# Altium schematic symbol library jlcpcb_2025_04_inductors_extended_0603.schlib: 1269 symbols (part 3 of 7) (continued)
## LQM18NNR68K00D
designator L?  Inductance: 680nH
Inductor, 680nH, ±10%, 1.7Ω, 35mA, SMD 0603; Manufacturer: Murata Electronics; Manufacturer Part Number: LQM18NNR68K00D; Self-Resonant Frequency: 90MHz; Q Factor: 15@25MHz; Package Size: 0603; JLCPCB Basic Part: No; JLCPCB Part Number: C341780; Supplier 1: LCSC; Category: Inductors; Supplier Part Number 1: C341780; Tolerance: ±10%; Rated Current: 35mA; DC Resistance: 1.7Ω; RoHS: Yes; ComponentLink1Description: Datasheet; ComponentLink1URL: https://wmsc.lcsc.com/wmsc/upload/file/pdf/v2/lcsc/2304140030_Murata-Electronics-LQM18NNR68K00D_C341780.pdf; ComponentLink2Description: JLCPCB Part URL; ComponentLink2URL: https://jlcpcb.com/partdetail/C341780; ComponentLink3Description: LCSC Part URL; ComponentLink3URL: https://lcsc.com/product-detail/Inductors-SMD_Murata-Electronics-Murata-Electronics-LQM18NNR68K00D_C341780.html
footprint IND-0603 (0603 (1608M) Inductor)
pins: 1, 2

## LQM18NNR82K00D
designator L?  Inductance: 820nH
Inductor, 820nH, ±10%, 2.1Ω, 35mA, SMD 0603; Manufacturer: Murata Electronics; Manufacturer Part Number: LQM18NNR82K00D; Self-Resonant Frequency: 85MHz; Q Factor: 15@25MHz; Package Size: 0603; JLCPCB Basic Part: No; JLCPCB Part Number: C882485; Supplier 1: LCSC; Category: Inductors; Supplier Part Number 1: C882485; Tolerance: ±10%; Rated Current: 35mA; DC Resistance: 2.1Ω; RoHS: Yes; ComponentLink1Description: Datasheet; ComponentLink1URL: https://wmsc.lcsc.com/wmsc/upload/file/pdf/v2/lcsc/2304140030_Murata-Electronics-LQM18NNR82K00D_C882485.pdf; ComponentLink2Description: JLCPCB Part URL; ComponentLink2URL: https://jlcpcb.com/partdetail/C882485; ComponentLink3Description: LCSC Part URL; ComponentLink3URL: https://lcsc.com/product-detail/Inductors-SMD_Murata-Electronics-Murata-Electronics-LQM18NNR82K00D_C882485.html
footprint IND-0603 (0603 (1608M) Inductor)
pins: 1, 2

## LQM18PH1R0MFRL
designator L?  Inductance: 1uH
Inductor, 1uH, ±20%, 200mΩ, SMD 0603; Manufacturer: Murata Electronics; Manufacturer Part Number: LQM18PH1R0MFRL; Saturation Current: 360mA; Self-Resonant Frequency: 100MHz; Package Size: 0603; JLCPCB Basic Part: No; JLCPCB Part Number: C1858042; Supplier 1: LCSC; Category: Inductors; Supplier Part Number 1: C1858042; Tolerance: ±20%; DC Resistance: 200mΩ; RoHS: Yes; ComponentLink1Description: Datasheet; ComponentLink1URL: https://wmsc.lcsc.com/wmsc/upload/file/pdf/v2/lcsc/2304140030_Murata-Electronics-LQM18PH1R0MFRL_C1858042.pdf; ComponentLink2Description: JLCPCB Part URL; ComponentLink2URL: https://jlcpcb.com/partdetail/C1858042; ComponentLink3Description: LCSC Part URL; ComponentLink3URL: https://lcsc.com/product-detail/Inductors-SMD_Murata-Electronics-Murata-Electronics-LQM18PH1R0MFRL_C1858042.html
footprint IND-0603 (0603 (1608M) Inductor)
pins: 1, 2

## LQM18PH2R2MFRL
designator L?  Inductance: 2.2uH
Inductor, 2.2uH, ±20%, 300mΩ, SMD 0603; Manufacturer: Murata Electronics; Manufacturer Part Number: LQM18PH2R2MFRL; Saturation Current: 150mA; Self-Resonant Frequency: 70MHz; Package Size: 0603; JLCPCB Basic Part: No; JLCPCB Part Number: C560036; Supplier 1: LCSC; Category: Inductors; Supplier Part Number 1: C560036; Tolerance: ±20%; DC Resistance: 300mΩ; RoHS: Yes; ComponentLink1Description: Datasheet; ComponentLink1URL: https://wmsc.lcsc.com/wmsc/upload/file/pdf/v2/lcsc/2008070932_Murata-Electronics-LQM18PH2R2MFRL_C560036.pdf; ComponentLink2Description: JLCPCB Part URL; ComponentLink2URL: https://jlcpcb.com/partdetail/C560036; ComponentLink3Description: LCSC Part URL; ComponentLink3URL: https://lcsc.com/product-detail/Inductors-SMD_Murata-Electronics-Murata-Electronics-LQM18PH2R2MFRL_C560036.html
footprint IND-0603 (0603 (1608M) Inductor)
pins: 1, 2

## LQM18PH3R3MFRL
designator L?  Inductance: 3.3uH
Inductor, 3.3uH, ±20%, 350mΩ, SMD 0603; Manufacturer: Murata Electronics; Manufacturer Part Number: LQM18PH3R3MFRL; Saturation Current: 80mA; Self-Resonant Frequency: 60MHz; Package Size: 0603; JLCPCB Basic Part: No; JLCPCB Part Number: C1857984; Supplier 1: LCSC; Category: Inductors; Supplier Part Number 1: C1857984; Tolerance: ±20%; DC Resistance: 350mΩ; RoHS: Yes; ComponentLink1Description: Datasheet; ComponentLink1URL: https://wmsc.lcsc.com/wmsc/upload/file/pdf/v2/lcsc/2304140030_Murata-Electronics-LQM18PH3R3MFRL_C1857984.pdf; ComponentLink2Description: JLCPCB Part URL; ComponentLink2URL: https://jlcpcb.com/partdetail/C1857984; ComponentLink3Description: LCSC Part URL; ComponentLink3URL: https://lcsc.com/product-detail/Inductors-SMD_Murata-Electronics-Murata-Electronics-LQM18PH3R3MFRL_C1857984.html
footprint IND-0603 (0603 (1608M) Inductor)
pins: 1, 2

## LQM18PH4R7MFRL
designator L?  Inductance: 4.7uH
Inductor, 4.7uH, ±20%, 440mΩ, SMD 0603; Manufacturer: Murata Electronics; Manufacturer Part Number: LQM18PH4R7MFRL; Saturation Current: 70mA; Self-Resonant Frequency: 40MHz; Package Size: 0603; JLCPCB Basic Part: No; JLCPCB Part Number: C1858257; Supplier 1: LCSC; Category: Inductors; Supplier Part Number 1: C1858257; Tolerance: ±20%; DC Resistance: 440mΩ; RoHS: Yes; ComponentLink1Description: Datasheet; ComponentLink1URL: https://wmsc.lcsc.com/wmsc/upload/file/pdf/v2/lcsc/2201271430_Murata-Electronics-LQM18PH4R7MFRL_C1858257.pdf; ComponentLink2Description: JLCPCB Part URL; ComponentLink2URL: https://jlcpcb.com/partdetail/C1858257; ComponentLink3Description: LCSC Part URL; ComponentLink3URL: https://lcsc.com/product-detail/Inductors-SMD_Murata-Electronics-Murata-Electronics-LQM18PH4R7MFRL_C1858257.html
footprint IND-0603 (0603 (1608M) Inductor)
pins: 1, 2

## LQM18PHR22MFRL
designator L?  Inductance: 220nH
Inductor, 220nH, ±20%, 110mΩ, 1.25A, SMD 0603; Manufacturer: Murata Electronics; Manufacturer Part Number: LQM18PHR22MFRL; Saturation Current: 1.5A; Self-Resonant Frequency: 100MHz; Package Size: 0603; JLCPCB Basic Part: No; JLCPCB Part Number: C1858104; Supplier 1: LCSC; Category: Inductors; Supplier Part Number 1: C1858104; Tolerance: ±20%; Rated Current: 1.25A; DC Resistance: 110mΩ; RoHS: Yes; ComponentLink1Description: Datasheet; ComponentLink1URL: https://wmsc.lcsc.com/wmsc/upload/file/pdf/v2/lcsc/2304140030_Murata-Electronics-LQM18PHR22MFRL_C1858104.pdf; ComponentLink2Description: JLCPCB Part URL; ComponentLink2URL: https://jlcpcb.com/partdetail/C1858104; ComponentLink3Description: LCSC Part URL; ComponentLink3URL: https://lcsc.com/product-detail/Inductors-SMD_Murata-Electronics-Murata-Electronics-LQM18PHR22MFRL_C1858104.html
footprint IND-0603 (0603 (1608M) Inductor)
pins: 1, 2

## LQM18PN1R0MFHD
designator L?  Inductance: 1uH
Inductor, 1uH, ±20%, 130mΩ, SMD 0603; Manufacturer: Murata Electronics; Manufacturer Part Number: LQM18PN1R0MFHD; Saturation Current: 550mA; Self-Resonant Frequency: 100MHz; Package Size: 0603; JLCPCB Basic Part: No; JLCPCB Part Number: C576540; Supplier 1: LCSC; Category: Inductors; Supplier Part Number 1: C576540; Tolerance: ±20%; DC Resistance: 130mΩ; RoHS: Yes; ComponentLink1Description: Datasheet; ComponentLink1URL: https://wmsc.lcsc.com/wmsc/upload/file/pdf/v2/lcsc/2304140030_Murata-Electronics-LQM18PN1R0MFHD_C576540.pdf; ComponentLink2Description: JLCPCB Part URL; ComponentLink2URL: https://jlcpcb.com/partdetail/C576540; ComponentLink3Description: LCSC Part URL; ComponentLink3URL: https://lcsc.com/product-detail/Inductors-SMD_Murata-Electronics-Murata-Electronics-LQM18PN1R0MFHD_C576540.html
footprint IND-0603 (0603 (1608M) Inductor)
pins: 1, 2

## LQM18PN1R0MFRL
designator L?  Inductance: 1uH
Inductor, 1uH, ±20%, 200mΩ, 950mA, SMD 0603; Manufacturer: Murata Electronics; Manufacturer Part Number: LQM18PN1R0MFRL; Self-Resonant Frequency: 100MHz; Package Size: 0603; JLCPCB Basic Part: No; JLCPCB Part Number: C307603; Supplier 1: LCSC; Category: Inductors; Supplier Part Number 1: C307603; Tolerance: ±20%; Rated Current: 950mA; DC Resistance: 200mΩ; RoHS: Yes; ComponentLink1Description: Datasheet; ComponentLink1URL: https://wmsc.lcsc.com/wmsc/upload/file/pdf/v2/lcsc/1912111437_Murata-Electronics-LQM18PN1R0MFRL_C307603.pdf; ComponentLink2Description: JLCPCB Part URL; ComponentLink2URL: https://jlcpcb.com/partdetail/C307603; ComponentLink3Description: LCSC Part URL; ComponentLink3URL: https://lcsc.com/product-detail/Inductors-SMD_Murata-Electronics-Murata-Electronics-LQM18PN1R0MFRL_C307603.html
footprint IND-0603 (0603 (1608M) Inductor)
pins: 1, 2

## LQM18PN1R0MGHD
designator L?  Inductance: 1uH
Inductor, 1uH, ±20%, 200mΩ, 900mA, SMD 0603; Manufacturer: Murata Electronics; Manufacturer Part Number: LQM18PN1R0MGHD; Self-Resonant Frequency: 100MHz; Package Size: 0603; JLCPCB Basic Part: No; JLCPCB Part Number: C711163; Supplier 1: LCSC; Category: Inductors; Supplier Part Number 1: C711163; Tolerance: ±20%; Rated Current: 900mA; Saturation Current: 900mA; DC Resistance: 200mΩ; RoHS: Yes; ComponentLink1Description: Datasheet; ComponentLink1URL: https://wmsc.lcsc.com/wmsc/upload/file/pdf/v2/lcsc/2304140030_Murata-Electronics-LQM18PN1R0MGHD_C711163.pdf; ComponentLink2Description: JLCPCB Part URL; ComponentLink2URL: https://jlcpcb.com/partdetail/C711163; ComponentLink3Description: LCSC Part URL; ComponentLink3URL: https://lcsc.com/product-detail/Inductors-SMD_Murata-Electronics-Murata-Electronics-LQM18PN1R0MGHD_C711163.html
footprint IND-0603 (0603 (1608M) Inductor)
pins: 1, 2

## LQM18PN1R0NC0L
designator L?  Inductance: 1uH
Inductor, 1uH, ±30%, 200mΩ, 750mA, SMD 0603; Manufacturer: Murata Electronics; Manufacturer Part Number: LQM18PN1R0NC0L; Self-Resonant Frequency: 50MHz; Package Size: 0603; JLCPCB Basic Part: No; JLCPCB Part Number: C668455; Supplier 1: LCSC; Category: Inductors; Supplier Part Number 1: C668455; Tolerance: ±30%; Rated Current: 750mA; DC Resistance: 200mΩ; RoHS: Yes; ComponentLink1Description: Datasheet; ComponentLink1URL: https://wmsc.lcsc.com/wmsc/upload/file/pdf/v2/lcsc/2304140030_Murata-Electronics-LQM18PN1R0NC0L_C668455.pdf; ComponentLink2Description: JLCPCB Part URL; ComponentLink2URL: https://jlcpcb.com/partdetail/C668455; ComponentLink3Description: LCSC Part URL; ComponentLink3URL: https://lcsc.com/product-detail/Inductors-SMD_Murata-Electronics-Murata-Electronics-LQM18PN1R0NC0L_C668455.html
footprint IND-0603 (0603 (1608M) Inductor)
pins: 1, 2

## LQM18PN1R0NF0L
designator L?  Inductance: 1uH
Inductor, 1uH, ±30%, 350mΩ, 600mA, SMD 0603; Manufacturer: Murata Electronics; Manufacturer Part Number: LQM18PN1R0NF0L; Self-Resonant Frequency: 50MHz; Package Size: 0603; JLCPCB Basic Part: No; JLCPCB Part Number: C440234; Supplier 1: LCSC; Category: Inductors; Supplier Part Number 1: C440234; Tolerance: ±30%; Rated Current: 600mA; DC Resistance: 350mΩ; RoHS: Yes; ComponentLink1Description: Datasheet; ComponentLink1URL: https://wmsc.lcsc.com/wmsc/upload/file/pdf/v2/lcsc/2304140030_Murata-Electronics-LQM18PN1R0NF0L_C440234.pdf; ComponentLink2Description: JLCPCB Part URL; ComponentLink2URL: https://jlcpcb.com/partdetail/C440234; ComponentLink3Description: LCSC Part URL; ComponentLink3URL: https://lcsc.com/product-detail/Inductors-SMD_Murata-Electronics-Murata-Electronics-LQM18PN1R0NF0L_C440234.html
footprint IND-0603 (0603 (1608M) Inductor)
pins: 1, 2

## LQM18PN1R5MFRL
designator L?  Inductance: 1.5uH
Inductor, 1.5uH, ±20%, 230mΩ, 800mA, SMD 0603; Manufacturer: Murata Electronics; Manufacturer Part Number: LQM18PN1R5MFRL; Package Size: 0603; JLCPCB Basic Part: No; JLCPCB Part Number: C337909; Supplier 1: LCSC; Category: Inductors; Supplier Part Number 1: C337909; Tolerance: ±20%; Rated Current: 800mA; DC Resistance: 230mΩ; RoHS: Yes; ComponentLink1Description: Datasheet; ComponentLink1URL: https://wmsc.lcsc.com/wmsc/upload/file/pdf/v2/lcsc/2304140030_Murata-Electronics-LQM18PN1R5MFRL_C337909.pdf; ComponentLink2Description: JLCPCB Part URL; ComponentLink2URL: https://jlcpcb.com/partdetail/C337909; ComponentLink3Description: LCSC Part URL; ComponentLink3URL: https://lcsc.com/product-detail/Inductors-SMD_Murata-Electronics-Murata-Electronics-LQM18PN1R5MFRL_C337909.html
footprint IND-0603 (0603 (1608M) Inductor)
pins: 1, 2

## LQM18PN1R8NC0L
designator L?  Inductance: 1.8uH
Inductor, 1.8uH, ±30%, 240mΩ, 700mA, SMD 0603; Manufacturer: Murata Electronics; Manufacturer Part Number: LQM18PN1R8NC0L; Self-Resonant Frequency: 50MHz; Package Size: 0603; JLCPCB Basic Part: No; JLCPCB Part Number: C703135; Supplier 1: LCSC; Category: Inductors; Supplier Part Number 1: C703135; Tolerance: ±30%; Rated Current: 700mA; DC Resistance: 240mΩ; RoHS: Yes; ComponentLink1Description: Datasheet; ComponentLink1URL: https://wmsc.lcsc.com/wmsc/upload/file/pdf/v2/lcsc/2304140030_Murata-Electronics-LQM18PN1R8NC0L_C703135.pdf; ComponentLink2Description: JLCPCB Part URL; ComponentLink2URL: https://jlcpcb.com/partdetail/C703135; ComponentLink3Description: LCSC Part URL; ComponentLink3URL: https://lcsc.com/product-detail/Inductors-SMD_Murata-Electronics-Murata-Electronics-LQM18PN1R8NC0L_C703135.html
footprint IND-0603 (0603 (1608M) Inductor)
pins: 1, 2

## LQM18PN2R2MDHD
designator L?  Inductance: 2.2uH
Inductor, 2.2uH, ±20%, 380mΩ, 650mA, SMD 0603; Manufacturer: Murata Electronics; Manufacturer Part Number: LQM18PN2R2MDHD; Saturation Current: 250mA; Self-Resonant Frequency: 60MHz; Package Size: 0603; JLCPCB Basic Part: No; JLCPCB Part Number: C307604; Supplier 1: LCSC; Category: Inductors; Supplier Part Number 1: C307604; Tolerance: ±20%; Rated Current: 650mA; DC Resistance: 380mΩ; RoHS: Yes; ComponentLink1Description: Datasheet; ComponentLink1URL: https://wmsc.lcsc.com/wmsc/upload/file/pdf/v2/lcsc/2304140030_Murata-Electronics-LQM18PN2R2MDHD_C307604.pdf; ComponentLink2Description: JLCPCB Part URL; ComponentLink2URL: https://jlcpcb.com/partdetail/C307604; ComponentLink3Description: LCSC Part URL; ComponentLink3URL: https://lcsc.com/product-detail/Inductors-SMD_Murata-Electronics-Murata-Electronics-LQM18PN2R2MDHD_C307604.html
footprint IND-0603 (0603 (1608M) Inductor)
pins: 1, 2

## LQM18PN2R2MFHD
designator L?  Inductance: 2.2uH
Inductor, 2.2uH, ±20%, 380mΩ, SMD 0603; Manufacturer: Murata Electronics; Manufacturer Part Number: LQM18PN2R2MFHD; Saturation Current: 300mA; Self-Resonant Frequency: 80MHz; Package Size: 0603; JLCPCB Basic Part: No; JLCPCB Part Number: C2046248; Supplier 1: LCSC; Category: Inductors; Supplier Part Number 1: C2046248; Tolerance: ±20%; DC Resistance: 380mΩ; RoHS: Yes; ComponentLink1Description: Datasheet; ComponentLink1URL: https://wmsc.lcsc.com/wmsc/upload/file/pdf/v2/lcsc/2202010300_Murata-Electronics-LQM18PN2R2MFHD_C2046248.pdf; ComponentLink2Description: JLCPCB Part URL; ComponentLink2URL: https://jlcpcb.com/partdetail/C2046248; ComponentLink3Description: LCSC Part URL; ComponentLink3URL: https://lcsc.com/product-detail/Inductors-SMD_Murata-Electronics-Murata-Electronics-LQM18PN2R2MFHD_C2046248.html
footprint IND-0603 (0603 (1608M) Inductor)
pins: 1, 2

## LQM18PN2R2MFRL
designator L?  Inductance: 2.2uH
Inductor, 2.2uH, ±20%, 300mΩ, 750mA, SMD 0603; Manufacturer: Murata Electronics; Manufacturer Part Number: LQM18PN2R2MFRL; Self-Resonant Frequency: 70MHz; Package Size: 0603; JLCPCB Basic Part: No; JLCPCB Part Number: C337910; Supplier 1: LCSC; Category: Inductors; Supplier Part Number 1: C337910; Tolerance: ±20%; Rated Current: 750mA; DC Resistance: 300mΩ; RoHS: Yes; ComponentLink1Description: Datasheet; ComponentLink1URL: https://wmsc.lcsc.com/wmsc/upload/file/pdf/v2/lcsc/1912111437_Murata-Electronics-LQM18PN2R2MFRL_C337910.pdf; ComponentLink2Description: JLCPCB Part URL; ComponentLink2URL: https://jlcpcb.com/partdetail/C337910; ComponentLink3Description: LCSC Part URL; ComponentLink3URL: https://lcsc.com/product-detail/Inductors-SMD_Murata-Electronics-Murata-Electronics-LQM18PN2R2MFRL_C337910.html
footprint IND-0603 (0603 (1608M) Inductor)
pins: 1, 2

## LQM18PN2R2MGHD
designator L?  Inductance: 2.2uH
Inductor, 2.2uH, ±20%, 200mΩ, 350mA, SMD 0603; Manufacturer: Murata Electronics; Manufacturer Part Number: LQM18PN2R2MGHD; Saturation Current: 250mA; Self-Resonant Frequency: 70MHz; Package Size: 0603; JLCPCB Basic Part: No; JLCPCB Part Number: C337911; Supplier 1: LCSC; Category: Inductors; Supplier Part Number 1: C337911; Tolerance: ±20%; Rated Current: 350mA; DC Resistance: 200mΩ; RoHS: Yes; ComponentLink1Description: Datasheet; ComponentLink1URL: https://wmsc.lcsc.com/wmsc/upload/file/pdf/v2/lcsc/2304140030_Murata-Electronics-LQM18PN2R2MGHD_C337911.pdf; ComponentLink2Description: JLCPCB Part URL; ComponentLink2URL: https://jlcpcb.com/partdetail/C337911; ComponentLink3Description: LCSC Part URL; ComponentLink3URL: https://lcsc.com/product-detail/Inductors-SMD_Murata-Electronics-Murata-Electronics-LQM18PN2R2MGHD_C337911.html
footprint IND-0603 (0603 (1608M) Inductor)
pins: 1, 2

## LQM18PN3R3MFRL
designator L?  Inductance: 3.3uH
Inductor, 3.3uH, ±20%, 437.5mΩ, 700mA, SMD 0603; Manufacturer: Murata Electronics; Manufacturer Part Number: LQM18PN3R3MFRL; Self-Resonant Frequency: 60MHz; Package Size: 0603; JLCPCB Basic Part: No; JLCPCB Part Number: C162581; Supplier 1: LCSC; Category: Inductors; Supplier Part Number 1: C162581; Tolerance: ±20%; Rated Current: 700mA; DC Resistance: 437.5mΩ; RoHS: Yes; ComponentLink1Description: Datasheet; ComponentLink1URL: https://wmsc.lcsc.com/wmsc/upload/file/pdf/v2/lcsc/2304140030_Murata-Electronics-LQM18PN3R3MFRL_C162581.pdf; ComponentLink2Description: JLCPCB Part URL; ComponentLink2URL: https://jlcpcb.com/partdetail/C162581; ComponentLink3Description: LCSC Part URL; ComponentLink3URL: https://lcsc.com/product-detail/Inductors-SMD_Murata-Electronics-Murata-Electronics-LQM18PN3R3MFRL_C162581.html
footprint IND-0603 (0603 (1608M) Inductor)
pins: 1, 2

## LQM18PN4R7MFRL
designator L?  Inductance: 4.7uH
Inductor, 4.7uH, ±20%, 440mΩ, 620mA, SMD 0603; Manufacturer: Murata Electronics; Manufacturer Part Number: LQM18PN4R7MFRL; Self-Resonant Frequency: 40MHz; Package Size: 0603; JLCPCB Basic Part: No; JLCPCB Part Number: C114862; Supplier 1: LCSC; Category: Inductors; Supplier Part Number 1: C114862; Tolerance: ±20%; Rated Current: 620mA; DC Resistance: 440mΩ; RoHS: Yes; ComponentLink1Description: Datasheet; ComponentLink1URL: https://wmsc.lcsc.com/wmsc/upload/file/pdf/v2/lcsc/2304140030_Murata-Electronics-LQM18PN4R7MFRL_C114862.pdf; ComponentLink2Description: JLCPCB Part URL; ComponentLink2URL: https://jlcpcb.com/partdetail/C114862; ComponentLink3Description: LCSC Part URL; ComponentLink3URL: https://lcsc.com/product-detail/Inductors-SMD_Murata-Electronics-Murata-Electronics-LQM18PN4R7MFRL_C114862.html
footprint IND-0603 (0603 (1608M) Inductor)
pins: 1, 2

## LQM18PNR47MFHD
designator L?  Inductance: 470nH
Inductor, 470nH, ±20%, 100mΩ, 1.5A, SMD 0603; Manufacturer: Murata Electronics; Manufacturer Part Number: LQM18PNR47MFHD; Self-Resonant Frequency: 100MHz; Package Size: 0603; JLCPCB Basic Part: No; JLCPCB Part Number: C2044483; Supplier 1: LCSC; Category: Inductors; Supplier Part Number 1: C2044483; Tolerance: ±20%; Rated Current: 1.5A; Saturation Current: 1.5A; DC Resistance: 100mΩ; RoHS: Yes; ComponentLink1Description: Datasheet; ComponentLink1URL: https://wmsc.lcsc.com/wmsc/upload/file/pdf/v2/lcsc/2304140030_Murata-Electronics-LQM18PNR47MFHD_C2044483.pdf; ComponentLink2Description: JLCPCB Part URL; ComponentLink2URL: https://jlcpcb.com/partdetail/C2044483; ComponentLink3Description: LCSC Part URL; ComponentLink3URL: https://lcsc.com/product-detail/Inductors-SMD_Murata-Electronics-Murata-Electronics-LQM18PNR47MFHD_C2044483.html
footprint IND-0603 (0603 (1608M) Inductor)
pins: 1, 2

## LQM18PNR47NC0L
designator L?  Inductance: 470nH
Inductor, 470nH, ±30%, 150mΩ, 850mA, SMD 0603; Manufacturer: Murata Electronics; Manufacturer Part Number: LQM18PNR47NC0L; Self-Resonant Frequency: 50MHz; Package Size: 0603; JLCPCB Basic Part: No; JLCPCB Part Number: C1333176; Supplier 1: LCSC; Category: Inductors; Supplier Part Number 1: C1333176; Tolerance: ±30%; Rated Current: 850mA; DC Resistance: 150mΩ; RoHS: Yes; ComponentLink1Description: Datasheet; ComponentLink1URL: https://wmsc.lcsc.com/wmsc/upload/file/pdf/v2/lcsc/2201141500_Murata-Electronics-LQM18PNR47NC0L_C1333176.pdf; ComponentLink2Description: JLCPCB Part URL; ComponentLink2URL: https://jlcpcb.com/partdetail/C1333176; ComponentLink3Description: LCSC Part URL; ComponentLink3URL: https://lcsc.com/product-detail/Inductors-SMD_Murata-Electronics-Murata-Electronics-LQM18PNR47NC0L_C1333176.html
footprint IND-0603 (0603 (1608M) Inductor)
pins: 1, 2

## LQM18PW1R0MCHD
designator L?  Inductance: 1uH
Inductor, 1uH, ±20%, 230mΩ, SMD 0603; Manufacturer: Murata Electronics; Manufacturer Part Number: LQM18PW1R0MCHD; Saturation Current: 600mA; Self-Resonant Frequency: 70MHz; Package Size: 0603; JLCPCB Basic Part: No; JLCPCB Part Number: C909842; Supplier 1: LCSC; Category: Inductors; Supplier Part Number 1: C909842; Tolerance: ±20%; DC Resistance: 230mΩ; RoHS: Yes; ComponentLink1Description: Datasheet; ComponentLink1URL: https://wmsc.lcsc.com/wmsc/upload/file/pdf/v2/lcsc/2304140030_Murata-Electronics-LQM18PW1R0MCHD_C909842.pdf; ComponentLink2Description: JLCPCB Part URL; ComponentLink2URL: https://jlcpcb.com/partdetail/C909842; ComponentLink3Description: LCSC Part URL; ComponentLink3URL: https://lcsc.com/product-detail/Inductors-SMD_Murata-Electronics-Murata-Electronics-LQM18PW1R0MCHD_C909842.html
footprint IND-0603 (0603 (1608M) Inductor)
pins: 1, 2

## LQM18PZ2R2MFHD
designator L?  Inductance: 2.2uH
Inductor, 2.2uH, ±20%, 470mΩ, 300mA, SMD 0603; Manufacturer: Murata Electronics; Manufacturer Part Number: LQM18PZ2R2MFHD; Self-Resonant Frequency: 80MHz; Package Size: 0603; JLCPCB Basic Part: No; JLCPCB Part Number: C2041549; Supplier 1: LCSC; Category: Inductors; Supplier Part Number 1: C2041549; Tolerance: ±20%; Rated Current: 300mA; Saturation Current: 300mA; DC Resistance: 470mΩ; RoHS: Yes; ComponentLink1Description: Datasheet; ComponentLink1URL: https://wmsc.lcsc.com/wmsc/upload/file/pdf/v2/lcsc/2201312330_Murata-Electronics-LQM18PZ2R2MFHD_C2041549.pdf; ComponentLink2Description: JLCPCB Part URL; ComponentLink2URL: https://jlcpcb.com/partdetail/C2041549; ComponentLink3Description: LCSC Part URL; ComponentLink3URL: https://lcsc.com/product-detail/Inductors-SMD_Murata-Electronics-Murata-Electronics-LQM18PZ2R2MFHD_C2041549.html
footprint IND-0603 (0603 (1608M) Inductor)
pins: 1, 2

## LQP18MN8N2C02D
designator L?  Inductance: 8.2nH
Inductor, 8.2nH, 800mΩ, 150mA, SMD 0603; Manufacturer: Murata Electronics; Manufacturer Part Number: LQP18MN8N2C02D; Self-Resonant Frequency: 3.6GHz; Q Factor: 17@500MHz; Package Size: 0603; JLCPCB Basic Part: No; JLCPCB Part Number: C524640; Supplier 1: LCSC; Category: Inductors; Supplier Part Number 1: C524640; Rated Current: 150mA; DC Resistance: 800mΩ; RoHS: Yes; ComponentLink1Description: Datasheet; ComponentLink1URL: https://wmsc.lcsc.com/wmsc/upload/file/pdf/v2/lcsc/2304140030_Murata-Electronics-LQP18MN8N2C02D_C524640.pdf; ComponentLink2Description: JLCPCB Part URL; ComponentLink2URL: https://jlcpcb.com/partdetail/C524640; ComponentLink3Description: LCSC Part URL; ComponentLink3URL: https://lcsc.com/product-detail/Inductors-SMD_Murata-Electronics-Murata-Electronics-LQP18MN8N2C02D_C524640.html
footprint IND-0603 (0603 (1608M) Inductor)
pins: 1, 2

## LQP18MN22NG02D
designator L?  Inductance: 22nH
Inductor, 22nH, ±2%, 1.9Ω, 100mA, SMD 0603; Manufacturer: Murata Electronics; Manufacturer Part Number: LQP18MN22NG02D; Self-Resonant Frequency: 500MHz; Q Factor: 17@500MHz; Package Size: 0603; JLCPCB Basic Part: No; JLCPCB Part Number: C524638; Supplier 1: LCSC; Category: Inductors; Supplier Part Number 1: C524638; Tolerance: ±2%; Rated Current: 100mA; DC Resistance: 1.9Ω; RoHS: Yes; ComponentLink1Description: Datasheet; ComponentLink1URL: https://wmsc.lcsc.com/wmsc/upload/file/pdf/v2/lcsc/2304140030_Murata-Electronics-LQP18MN22NG02D_C524638.pdf; ComponentLink2Description: JLCPCB Part URL; ComponentLink2URL: https://jlcpcb.com/partdetail/C524638; ComponentLink3Description: LCSC Part URL; ComponentLink3URL: https://lcsc.com/product-detail/Inductors-SMD_Murata-Electronics-Murata-Electronics-LQP18MN22NG02D_C524638.html
footprint IND-0603 (0603 (1608M) Inductor)
pins: 1, 2

## LQW18AN2N2C80D
designator L?  Inductance: 2.2nH
Inductor, 2.2nH, 18mΩ, 3.2A, SMD 0603; Manufacturer: Murata Electronics; Manufacturer Part Number: LQW18AN2N2C80D; Self-Resonant Frequency: 15GHz; Q Factor: 24@250MHz; Package Size: 0603; JLCPCB Basic Part: No; JLCPCB Part Number: C71648; Supplier 1: LCSC; Category: Inductors; Supplier Part Number 1: C71648; Rated Current: 3.2A; DC Resistance: 18mΩ; RoHS: Yes; ComponentLink1Description: Datasheet; ComponentLink1URL: https://wmsc.lcsc.com/wmsc/upload/file/pdf/v2/lcsc/2304140030_Murata-Electronics-LQW18AN2N2C80D_C71648.pdf; ComponentLink2Description: JLCPCB Part URL; ComponentLink2URL: https://jlcpcb.com/partdetail/C71648; ComponentLink3Description: LCSC Part URL; ComponentLink3URL: https://lcsc.com/product-detail/Inductors-SMD_Murata-Electronics-Murata-Electronics-LQW18AN2N2C80D_C71648.html
footprint IND-0603 (0603 (1608M) Inductor)
pins: 1, 2

## LQW18AN2N2D0ZD
designator L?  Inductance: 2.2nH
Inductor, 2.2nH, 42mΩ, SMD 0603; Manufacturer: Murata Electronics; Manufacturer Part Number: LQW18AN2N2D0ZD; Self-Resonant Frequency: 6GHz; Q Factor: 16@250MHz; Package Size: 0603; JLCPCB Basic Part: No; JLCPCB Part Number: C237544; Supplier 1: LCSC; Category: Inductors; Supplier Part Number 1: C237544; DC Resistance: 42mΩ; RoHS: Yes; ComponentLink1Description: Datasheet; ComponentLink1URL: https://wmsc.lcsc.com/wmsc/upload/file/pdf/v2/lcsc/2304140030_Murata-Electronics-LQW18AN2N2D0ZD_C237544.pdf; ComponentLink2Description: JLCPCB Part URL; ComponentLink2URL: https://jlcpcb.com/partdetail/C237544; ComponentLink3Description: LCSC Part URL; ComponentLink3URL: https://lcsc.com/product-detail/Inductors-SMD_Murata-Electronics-Murata-Electronics-LQW18AN2N2D0ZD_C237544.html
footprint IND-0603 (0603 (1608M) Inductor)
pins: 1, 2

## LQW18AN2N2D10D
designator L?  Inductance: 2.2nH
Inductor, 2.2nH, 18mΩ, 1.4A, SMD 0603; Manufacturer: Murata Electronics; Manufacturer Part Number: LQW18AN2N2D10D; Package Size: 0603; JLCPCB Basic Part: No; JLCPCB Part Number: C701164; Supplier 1: LCSC; Category: Inductors; Supplier Part Number 1: C701164; Rated Current: 1.4A; DC Resistance: 18mΩ; RoHS: Yes; ComponentLink1Description: Datasheet; ComponentLink1URL: https://wmsc.lcsc.com/wmsc/upload/file/pdf/v2/lcsc/2009291135_Murata-Electronics-LQW18AN2N2D10D_C701164.pdf; ComponentLink2Description: JLCPCB Part URL; ComponentLink2URL: https://jlcpcb.com/partdetail/C701164; ComponentLink3Description: LCSC Part URL; ComponentLink3URL: https://lcsc.com/product-detail/Power-Inductors_Murata-Electronics-Murata-Electronics-LQW18AN2N2D10D_C701164.html
footprint IND-0603 (0603 (1608M) Inductor)
pins: 1, 2

## LQW18AN2N4C8ZD
designator L?  Inductance: 2.4nH
Inductor, 2.4nH, 26mΩ, 2.4A, SMD 0603; Manufacturer: Murata Electronics; Manufacturer Part Number: LQW18AN2N4C8ZD; Package Size: 0603; JLCPCB Basic Part: No; JLCPCB Part Number: C2042508; Supplier 1: LCSC; Category: Inductors; Supplier Part Number 1: C2042508; Rated Current: 2.4A; DC Resistance: 26mΩ; RoHS: Yes; ComponentLink1Description: Datasheet; ComponentLink1URL: https://wmsc.lcsc.com/wmsc/upload/file/pdf/v2/lcsc/2304140030_Murata-Electronics-LQW18AN2N4C8ZD_C2042508.pdf; ComponentLink2Description: JLCPCB Part URL; ComponentLink2URL: https://jlcpcb.com/partdetail/C2042508; ComponentLink3Description: LCSC Part URL; ComponentLink3URL: https://lcsc.com/product-detail/Power-Inductors_Murata-Electronics-Murata-Electronics-LQW18AN2N4C8ZD_C2042508.html
footprint IND-0603 (0603 (1608M) Inductor)
pins: 1, 2

## LQW18AN3N0C80D
designator L?  Inductance: 3nH
Inductor, 3nH, 170mΩ, 670mA, SMD 0603; Manufacturer: Murata Electronics; Manufacturer Part Number: LQW18AN3N0C80D; Package Size: 0603; JLCPCB Basic Part: No; JLCPCB Part Number: C882466; Supplier 1: LCSC; Category: Inductors; Supplier Part Number 1: C882466; Rated Current: 670mA; DC Resistance: 170mΩ; RoHS: Yes; ComponentLink1Description: Datasheet; ComponentLink1URL: https://wmsc.lcsc.com/wmsc/upload/file/pdf/v2/lcsc/2304140030_Murata-Electronics-LQW18AN3N0C80D_C882466.pdf; ComponentLink2Description: JLCPCB Part URL; ComponentLink2URL: https://jlcpcb.com/partdetail/C882466; ComponentLink3Description: LCSC Part URL; ComponentLink3URL: https://lcsc.com/product-detail/Power-Inductors_Murata-Electronics-Murata-Electronics-LQW18AN3N0C80D_C882466.html
footprint IND-0603 (0603 (1608M) Inductor)
pins: 1, 2

## LQW18AN3N6C0ZD
designator L?  Inductance: 3.6nH
Inductor, 3.6nH, 59mΩ, SMD 0603; Manufacturer: Murata Electronics; Manufacturer Part Number: LQW18AN3N6C0ZD; Self-Resonant Frequency: 6GHz; Q Factor: 25@250MHz; Package Size: 0603; JLCPCB Basic Part: No; JLCPCB Part Number: C237545; Supplier 1: LCSC; Category: Inductors; Supplier Part Number 1: C237545; DC Resistance: 59mΩ; RoHS: Yes; ComponentLink1Description: Datasheet; ComponentLink1URL: https://wmsc.lcsc.com/wmsc/upload/file/pdf/v2/lcsc/2304140030_Murata-Electronics-LQW18AN3N6C0ZD_C237545.pdf; ComponentLink2Description: JLCPCB Part URL; ComponentLink2URL: https://jlcpcb.com/partdetail/C237545; ComponentLink3Description: LCSC Part URL; ComponentLink3URL: https://lcsc.com/product-detail/Inductors-SMD_Murata-Electronics-Murata-Electronics-LQW18AN3N6C0ZD_C237545.html
footprint IND-0603 (0603 (1608M) Inductor)
pins: 1, 2

## LQW18AN3N6D00D
designator L?  Inductance: 3.6nH
Inductor, 3.6nH, 59mΩ, 850mA, SMD 0603; Manufacturer: Murata Electronics; Manufacturer Part Number: LQW18AN3N6D00D; Self-Resonant Frequency: 6GHz; Q Factor: 25@250MHz; Package Size: 0603; JLCPCB Basic Part: No; JLCPCB Part Number: C341694; Supplier 1: LCSC; Category: Inductors; Supplier Part Number 1: C341694; Rated Current: 850mA; DC Resistance: 59mΩ; RoHS: Yes; ComponentLink1Description: Datasheet; ComponentLink1URL: https://wmsc.lcsc.com/wmsc/upload/file/pdf/v2/lcsc/2308111513_Murata-Electronics-LQW18AN3N6D00D_C341694.pdf; ComponentLink2Description: JLCPCB Part URL; ComponentLink2URL: https://jlcpcb.com/partdetail/C341694; ComponentLink3Description: LCSC Part URL; ComponentLink3URL: https://lcsc.com/product-detail/Inductors-SMD_Murata-Electronics-Murata-Electronics-LQW18AN3N6D00D_C341694.html
footprint IND-0603 (0603 (1608M) Inductor)
pins: 1, 2

## LQW18AN3N9C10D
designator L?  Inductance: 3.9nH
Inductor, 3.9nH, 32mΩ, 1A, SMD 0603; Manufacturer: Murata Electronics; Manufacturer Part Number: LQW18AN3N9C10D; Self-Resonant Frequency: 11GHz; Q Factor: 38@250MHz; Package Size: 0603; JLCPCB Basic Part: No; JLCPCB Part Number: C521237; Supplier 1: LCSC; Category: Inductors; Supplier Part Number 1: C521237; Rated Current: 1A; DC Resistance: 32mΩ; RoHS: Yes; ComponentLink1Description: Datasheet; ComponentLink1URL: https://wmsc.lcsc.com/wmsc/upload/file/pdf/v2/lcsc/2005090932_Murata-Electronics-LQW18AN3N9C10D_C521237.pdf; ComponentLink2Description: JLCPCB Part URL; ComponentLink2URL: https://jlcpcb.com/partdetail/C521237; ComponentLink3Description: LCSC Part URL; ComponentLink3URL: https://lcsc.com/product-detail/Inductors-SMD_Murata-Electronics-Murata-Electronics-LQW18AN3N9C10D_C521237.html
footprint IND-0603 (0603 (1608M) Inductor)
pins: 1, 2

## LQW18AN3N9D00D
designator L?  Inductance: 3.9nH
Inductor, 3.9nH, 59mΩ, SMD 0603; Manufacturer: Murata Electronics; Manufacturer Part Number: LQW18AN3N9D00D; Self-Resonant Frequency: 6GHz; Q Factor: 35@250MHz; Package Size: 0603; JLCPCB Basic Part: No; JLCPCB Part Number: C113125; Supplier 1: LCSC; Category: Inductors; Supplier Part Number 1: C113125; DC Resistance: 59mΩ; RoHS: Yes; ComponentLink1Description: Datasheet; ComponentLink1URL: https://wmsc.lcsc.com/wmsc/upload/file/pdf/v2/lcsc/2304140030_Murata-Electronics-LQW18AN3N9D00D_C113125.pdf; ComponentLink2Description: JLCPCB Part URL; ComponentLink2URL: https://jlcpcb.com/partdetail/C113125; ComponentLink3Description: LCSC Part URL; ComponentLink3URL: https://lcsc.com/product-detail/Inductors-SMD_Murata-Electronics-Murata-Electronics-LQW18AN3N9D00D_C113125.html
footprint IND-0603 (0603 (1608M) Inductor)
pins: 1, 2

## LQW18AN3N9D10D
designator L?  Inductance: 3.9nH
Inductor, 3.9nH, 32mΩ, 1A, SMD 0603; Manufacturer: Murata Electronics; Manufacturer Part Number: LQW18AN3N9D10D; Package Size: 0603; JLCPCB Basic Part: No; JLCPCB Part Number: C913689; Supplier 1: LCSC; Category: Inductors; Supplier Part Number 1: C913689; Rated Current: 1A; DC Resistance: 32mΩ; RoHS: Yes; ComponentLink1Description: Datasheet; ComponentLink1URL: https://wmsc.lcsc.com/wmsc/upload/file/pdf/v2/lcsc/2304140030_Murata-Electronics-LQW18AN3N9D10D_C913689.pdf; ComponentLink2Description: JLCPCB Part URL; ComponentLink2URL: https://jlcpcb.com/partdetail/C913689; ComponentLink3Description: LCSC Part URL; ComponentLink3URL: https://lcsc.com/product-detail/Power-Inductors_Murata-Electronics-Murata-Electronics-LQW18AN3N9D10D_C913689.html
footprint IND-0603 (0603 (1608M) Inductor)
pins: 1, 2

## LQW18AN4N2B8ZD
designator L?  Inductance: 4.2nH
Inductor, 4.2nH, 28mΩ, 2.2A, SMD 0603; Manufacturer: Murata Electronics; Manufacturer Part Number: LQW18AN4N2B8ZD; Package Size: 0603; JLCPCB Basic Part: No; JLCPCB Part Number: C2042579; Supplier 1: LCSC; Category: Inductors; Supplier Part Number 1: C2042579; Rated Current: 2.2A; DC Resistance: 28mΩ; RoHS: Yes; ComponentLink1Description: Datasheet; ComponentLink1URL: https://wmsc.lcsc.com/wmsc/upload/file/pdf/v2/lcsc/2304140030_Murata-Electronics-LQW18AN4N2B8ZD_C2042579.pdf; ComponentLink2Description: JLCPCB Part URL; ComponentLink2URL: https://jlcpcb.com/partdetail/C2042579; ComponentLink3Description: LCSC Part URL; ComponentLink3URL: https://lcsc.com/product-detail/Power-Inductors_Murata-Electronics-Murata-Electronics-LQW18AN4N2B8ZD_C2042579.html
footprint IND-0603 (0603 (1608M) Inductor)
pins: 1, 2

## LQW18AN4N3C00D
designator L?  Inductance: 4.3nH
Inductor, 4.3nH, 59mΩ, 850mA, SMD 0603; Manufacturer: Murata Electronics; Manufacturer Part Number: LQW18AN4N3C00D; Self-Resonant Frequency: 6GHz; Q Factor: 35@250MHz; Package Size: 0603; JLCPCB Basic Part: No; JLCPCB Part Number: C113127; Supplier 1: LCSC; Category: Inductors; Supplier Part Number 1: C113127; Rated Current: 850mA; DC Resistance: 59mΩ; RoHS: Yes; ComponentLink1Description: Datasheet; ComponentLink1URL: https://wmsc.lcsc.com/wmsc/upload/file/pdf/v2/lcsc/2304140030_Murata-Electronics-LQW18AN4N3C00D_C113127.pdf; ComponentLink2Description: JLCPCB Part URL; ComponentLink2URL: https://jlcpcb.com/partdetail/C113127; ComponentLink3Description: LCSC Part URL; ComponentLink3URL: https://lcsc.com/product-detail/Inductors-SMD_Murata-Electronics-Murata-Electronics-LQW18AN4N3C00D_C113127.html
footprint IND-0603 (0603 (1608M) Inductor)
pins: 1, 2

## LQW18AN4N3D00D
designator L?  Inductance: 4.3nH
Inductor, 4.3nH, 59mΩ, SMD 0603; Manufacturer: Murata Electronics; Manufacturer Part Number: LQW18AN4N3D00D; Self-Resonant Frequency: 6GHz; Q Factor: 35@250MHz; Package Size: 0603; JLCPCB Basic Part: No; JLCPCB Part Number: C440243; Supplier 1: LCSC; Category: Inductors; Supplier Part Number 1: C440243; DC Resistance: 59mΩ; RoHS: Yes; ComponentLink1Description: Datasheet; ComponentLink1URL: https://wmsc.lcsc.com/wmsc/upload/file/pdf/v2/lcsc/2304140030_Murata-Electronics-LQW18AN4N3D00D_C440243.pdf; ComponentLink2Description: JLCPCB Part URL; ComponentLink2URL: https://jlcpcb.com/partdetail/C440243; ComponentLink3Description: LCSC Part URL; ComponentLink3URL: https://lcsc.com/product-detail/Inductors-SMD_Murata-Electronics-Murata-Electronics-LQW18AN4N3D00D_C440243.html
footprint IND-0603 (0603 (1608M) Inductor)
pins: 1, 2

## LQW18AN4N7D00D
designator L?  Inductance: 4.7nH
Inductor, 4.7nH, 59mΩ, SMD 0603; Manufacturer: Murata Electronics; Manufacturer Part Number: LQW18AN4N7D00D; Self-Resonant Frequency: 6GHz; Q Factor: 35@250MHz; Package Size: 0603; JLCPCB Basic Part: No; JLCPCB Part Number: C98078; Supplier 1: LCSC; Category: Inductors; Supplier Part Number 1: C98078; DC Resistance: 59mΩ; RoHS: Yes; ComponentLink1Description: Datasheet; ComponentLink1URL: https://wmsc.lcsc.com/wmsc/upload/file/pdf/v2/lcsc/2304140030_Murata-Electronics-LQW18AN4N7D00D_C98078.pdf; ComponentLink2Description: JLCPCB Part URL; ComponentLink2URL: https://jlcpcb.com/partdetail/C98078; ComponentLink3Description: LCSC Part URL; ComponentLink3URL: https://lcsc.com/product-detail/Inductors-SMD_Murata-Electronics-Murata-Electronics-LQW18AN4N7D00D_C98078.html
footprint IND-0603 (0603 (1608M) Inductor)
pins: 1, 2

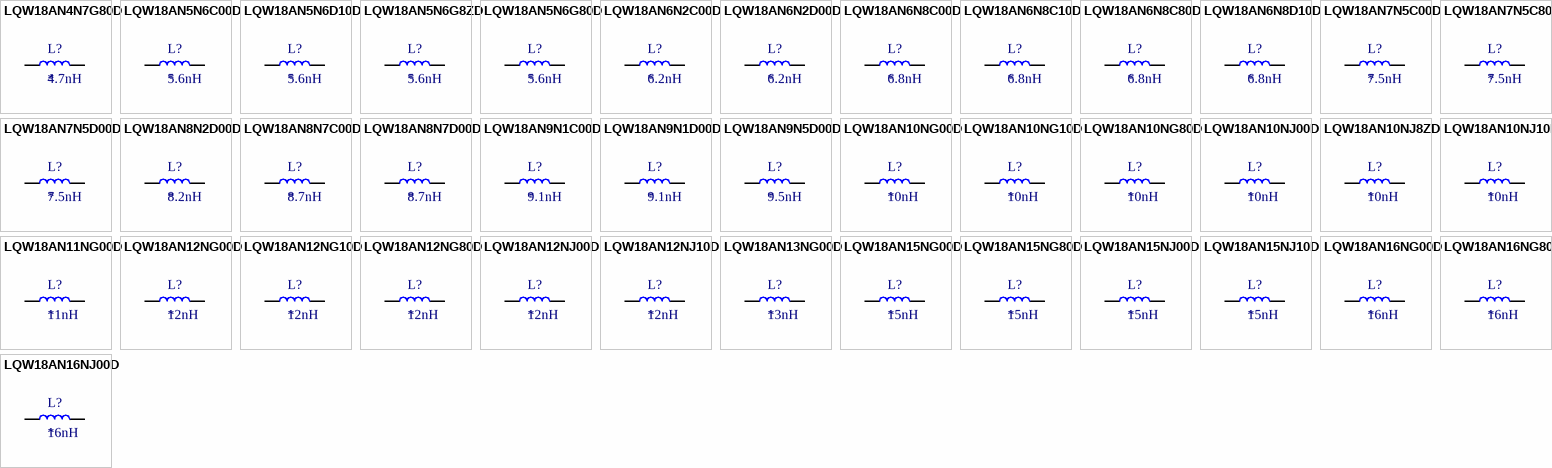
[diagram p14: symbols LQW18AN4N7G80D to LQW18AN16NJ00D]

## LQW18AN4N7G80D
designator L?  Inductance: 4.7nH
Inductor, 4.7nH, ±2%, 54mΩ, SMD 0603; Manufacturer: Murata Electronics; Manufacturer Part Number: LQW18AN4N7G80D; Self-Resonant Frequency: 10.4GHz; Q Factor: 25@250MHz; Package Size: 0603; JLCPCB Basic Part: No; JLCPCB Part Number: C162647; Supplier 1: LCSC; Category: Inductors; Supplier Part Number 1: C162647; Tolerance: ±2%; DC Resistance: 54mΩ; RoHS: Yes; ComponentLink1Description: Datasheet; ComponentLink1URL: https://wmsc.lcsc.com/wmsc/upload/file/pdf/v2/lcsc/1810311126_Murata-Electronics-LQW18AN4N7G80D_C162647.pdf; ComponentLink2Description: JLCPCB Part URL; ComponentLink2URL: https://jlcpcb.com/partdetail/C162647; ComponentLink3Description: LCSC Part URL; ComponentLink3URL: https://lcsc.com/product-detail/Inductors-SMD_Murata-Electronics-Murata-Electronics-LQW18AN4N7G80D_C162647.html
footprint IND-0603 (0603 (1608M) Inductor)
pins: 1, 2

## LQW18AN5N6C00D
designator L?  Inductance: 5.6nH
Inductor, 5.6nH, 82mΩ, 750mA, SMD 0603; Manufacturer: Murata Electronics; Manufacturer Part Number: LQW18AN5N6C00D; Self-Resonant Frequency: 6GHz; Q Factor: 35@250MHz; Package Size: 0603; JLCPCB Basic Part: No; JLCPCB Part Number: C98081; Supplier 1: LCSC; Category: Inductors; Supplier Part Number 1: C98081; Rated Current: 750mA; DC Resistance: 82mΩ; RoHS: Yes; ComponentLink1Description: Datasheet; ComponentLink1URL: https://wmsc.lcsc.com/wmsc/upload/file/pdf/v2/lcsc/2304140030_Murata-Electronics-LQW18AN5N6C00D_C98081.pdf; ComponentLink2Description: JLCPCB Part URL; ComponentLink2URL: https://jlcpcb.com/partdetail/C98081; ComponentLink3Description: LCSC Part URL; ComponentLink3URL: https://lcsc.com/product-detail/Inductors-SMD_Murata-Electronics-Murata-Electronics-LQW18AN5N6C00D_C98081.html
footprint IND-0603 (0603 (1608M) Inductor)
pins: 1, 2

## LQW18AN5N6D10D
designator L?  Inductance: 5.6nH
Inductor, 5.6nH, 45mΩ, SMD 0603; Manufacturer: Murata Electronics; Manufacturer Part Number: LQW18AN5N6D10D; Self-Resonant Frequency: 10GHz; Q Factor: 38@250MHz; Package Size: 0603; JLCPCB Basic Part: No; JLCPCB Part Number: C341789; Supplier 1: LCSC; Category: Inductors; Supplier Part Number 1: C341789; DC Resistance: 45mΩ; RoHS: Yes; ComponentLink1Description: Datasheet; ComponentLink1URL: https://wmsc.lcsc.com/wmsc/upload/file/pdf/v2/lcsc/2304140030_Murata-Electronics-LQW18AN5N6D10D_C341789.pdf; ComponentLink2Description: JLCPCB Part URL; ComponentLink2URL: https://jlcpcb.com/partdetail/C341789; ComponentLink3Description: LCSC Part URL; ComponentLink3URL: https://lcsc.com/product-detail/Inductors-SMD_Murata-Electronics-Murata-Electronics-LQW18AN5N6D10D_C341789.html
footprint IND-0603 (0603 (1608M) Inductor)
pins: 1, 2

## LQW18AN5N6G8ZD
designator L?  Inductance: 5.6nH
Inductor, 5.6nH, ±2%, 40mΩ, 1.9A, SMD 0603; Manufacturer: Murata Electronics; Manufacturer Part Number: LQW18AN5N6G8ZD; Package Size: 0603; JLCPCB Basic Part: No; JLCPCB Part Number: C2041812; Supplier 1: LCSC; Category: Inductors; Supplier Part Number 1: C2041812; Tolerance: ±2%; Rated Current: 1.9A; DC Resistance: 40mΩ; RoHS: Yes; ComponentLink1Description: Datasheet; ComponentLink1URL: https://wmsc.lcsc.com/wmsc/upload/file/pdf/v2/lcsc/2304140030_Murata-Electronics-LQW18AN5N6G8ZD_C2041812.pdf; ComponentLink2Description: JLCPCB Part URL; ComponentLink2URL: https://jlcpcb.com/partdetail/C2041812; ComponentLink3Description: LCSC Part URL; ComponentLink3URL: https://lcsc.com/product-detail/Power-Inductors_Murata-Electronics-Murata-Electronics-LQW18AN5N6G8ZD_C2041812.html
footprint IND-0603 (0603 (1608M) Inductor)
pins: 1, 2

## LQW18AN5N6G80D
designator L?  Inductance: 5.6nH
Inductor, 5.6nH, ±2%, 40mΩ, 1.9A, SMD 0603; Manufacturer: Murata Electronics; Manufacturer Part Number: LQW18AN5N6G80D; Package Size: 0603; JLCPCB Basic Part: No; JLCPCB Part Number: C909847; Supplier 1: LCSC; Category: Inductors; Supplier Part Number 1: C909847; Tolerance: ±2%; Rated Current: 1.9A; DC Resistance: 40mΩ; RoHS: Yes; ComponentLink1Description: Datasheet; ComponentLink1URL: https://wmsc.lcsc.com/wmsc/upload/file/pdf/v2/lcsc/2304140030_Murata-Electronics-LQW18AN5N6G80D_C909847.pdf; ComponentLink2Description: JLCPCB Part URL; ComponentLink2URL: https://jlcpcb.com/partdetail/C909847; ComponentLink3Description: LCSC Part URL; ComponentLink3URL: https://lcsc.com/product-detail/Power-Inductors_Murata-Electronics-Murata-Electronics-LQW18AN5N6G80D_C909847.html
footprint IND-0603 (0603 (1608M) Inductor)
pins: 1, 2

## LQW18AN6N2C00D
designator L?  Inductance: 6.2nH
Inductor, 6.2nH, 82mΩ, 750mA, SMD 0603; Manufacturer: Murata Electronics; Manufacturer Part Number: LQW18AN6N2C00D; Self-Resonant Frequency: 6GHz; Q Factor: 35@250MHz; Package Size: 0603; JLCPCB Basic Part: No; JLCPCB Part Number: C98083; Supplier 1: LCSC; Category: Inductors; Supplier Part Number 1: C98083; Rated Current: 750mA; DC Resistance: 82mΩ; RoHS: Yes; ComponentLink1Description: Datasheet; ComponentLink1URL: https://wmsc.lcsc.com/wmsc/upload/file/pdf/v2/lcsc/2304140030_Murata-Electronics-LQW18AN6N2C00D_C98083.pdf; ComponentLink2Description: JLCPCB Part URL; ComponentLink2URL: https://jlcpcb.com/partdetail/C98083; ComponentLink3Description: LCSC Part URL; ComponentLink3URL: https://lcsc.com/product-detail/Inductors-SMD_Murata-Electronics-Murata-Electronics-LQW18AN6N2C00D_C98083.html
footprint IND-0603 (0603 (1608M) Inductor)
pins: 1, 2

## LQW18AN6N2D00D
designator L?  Inductance: 6.2nH
Inductor, 6.2nH, 82mΩ, 750mA, SMD 0603; Manufacturer: Murata Electronics; Manufacturer Part Number: LQW18AN6N2D00D; Self-Resonant Frequency: 6GHz; Q Factor: 35@250MHz; Package Size: 0603; JLCPCB Basic Part: No; JLCPCB Part Number: C113128; Supplier 1: LCSC; Category: Inductors; Supplier Part Number 1: C113128; Rated Current: 750mA; DC Resistance: 82mΩ; RoHS: Yes; ComponentLink1Description: Datasheet; ComponentLink1URL: https://wmsc.lcsc.com/wmsc/upload/file/pdf/v2/lcsc/2304140030_Murata-Electronics-LQW18AN6N2D00D_C113128.pdf; ComponentLink2Description: JLCPCB Part URL; ComponentLink2URL: https://jlcpcb.com/partdetail/C113128; ComponentLink3Description: LCSC Part URL; ComponentLink3URL: https://lcsc.com/product-detail/Inductors-SMD_Murata-Electronics-Murata-Electronics-LQW18AN6N2D00D_C113128.html
footprint IND-0603 (0603 (1608M) Inductor)
pins: 1, 2

## LQW18AN6N8C00D
designator L?  Inductance: 6.8nH
Inductor, 6.8nH, 82mΩ, 750mA, SMD 0603; Manufacturer: Murata Electronics; Manufacturer Part Number: LQW18AN6N8C00D; Self-Resonant Frequency: 6GHz; Q Factor: 35@250MHz; Package Size: 0603; JLCPCB Basic Part: No; JLCPCB Part Number: C86136; Supplier 1: LCSC; Category: Inductors; Supplier Part Number 1: C86136; Rated Current: 750mA; DC Resistance: 82mΩ; RoHS: Yes; ComponentLink1Description: Datasheet; ComponentLink1URL: https://wmsc.lcsc.com/wmsc/upload/file/pdf/v2/lcsc/1811132212_Murata-Electronics-LQW18AN6N8C00D_C86136.pdf; ComponentLink2Description: JLCPCB Part URL; ComponentLink2URL: https://jlcpcb.com/partdetail/C86136; ComponentLink3Description: LCSC Part URL; ComponentLink3URL: https://lcsc.com/product-detail/Inductors-SMD_Murata-Electronics-Murata-Electronics-LQW18AN6N8C00D_C86136.html
footprint IND-0603 (0603 (1608M) Inductor)
pins: 1, 2

## LQW18AN6N8C10D
designator L?  Inductance: 6.8nH
Inductor, 6.8nH, 45mΩ, SMD 0603; Manufacturer: Murata Electronics; Manufacturer Part Number: LQW18AN6N8C10D; Self-Resonant Frequency: 7GHz; Q Factor: 38@250MHz; Package Size: 0603; JLCPCB Basic Part: No; JLCPCB Part Number: C521236; Supplier 1: LCSC; Category: Inductors; Supplier Part Number 1: C521236; DC Resistance: 45mΩ; RoHS: Yes; ComponentLink1Description: Datasheet; ComponentLink1URL: https://wmsc.lcsc.com/wmsc/upload/file/pdf/v2/lcsc/2304140030_Murata-Electronics-LQW18AN6N8C10D_C521236.pdf; ComponentLink2Description: JLCPCB Part URL; ComponentLink2URL: https://jlcpcb.com/partdetail/C521236; ComponentLink3Description: LCSC Part URL; ComponentLink3URL: https://lcsc.com/product-detail/Inductors-SMD_Murata-Electronics-Murata-Electronics-LQW18AN6N8C10D_C521236.html
footprint IND-0603 (0603 (1608M) Inductor)
pins: 1, 2